# Altium schematic symbol library FPGA_Xilinx_Virtex6.SchLib: 28 symbols (part 2 of 15) (continued)
## XC6VHX255T-FF1923 (continued)
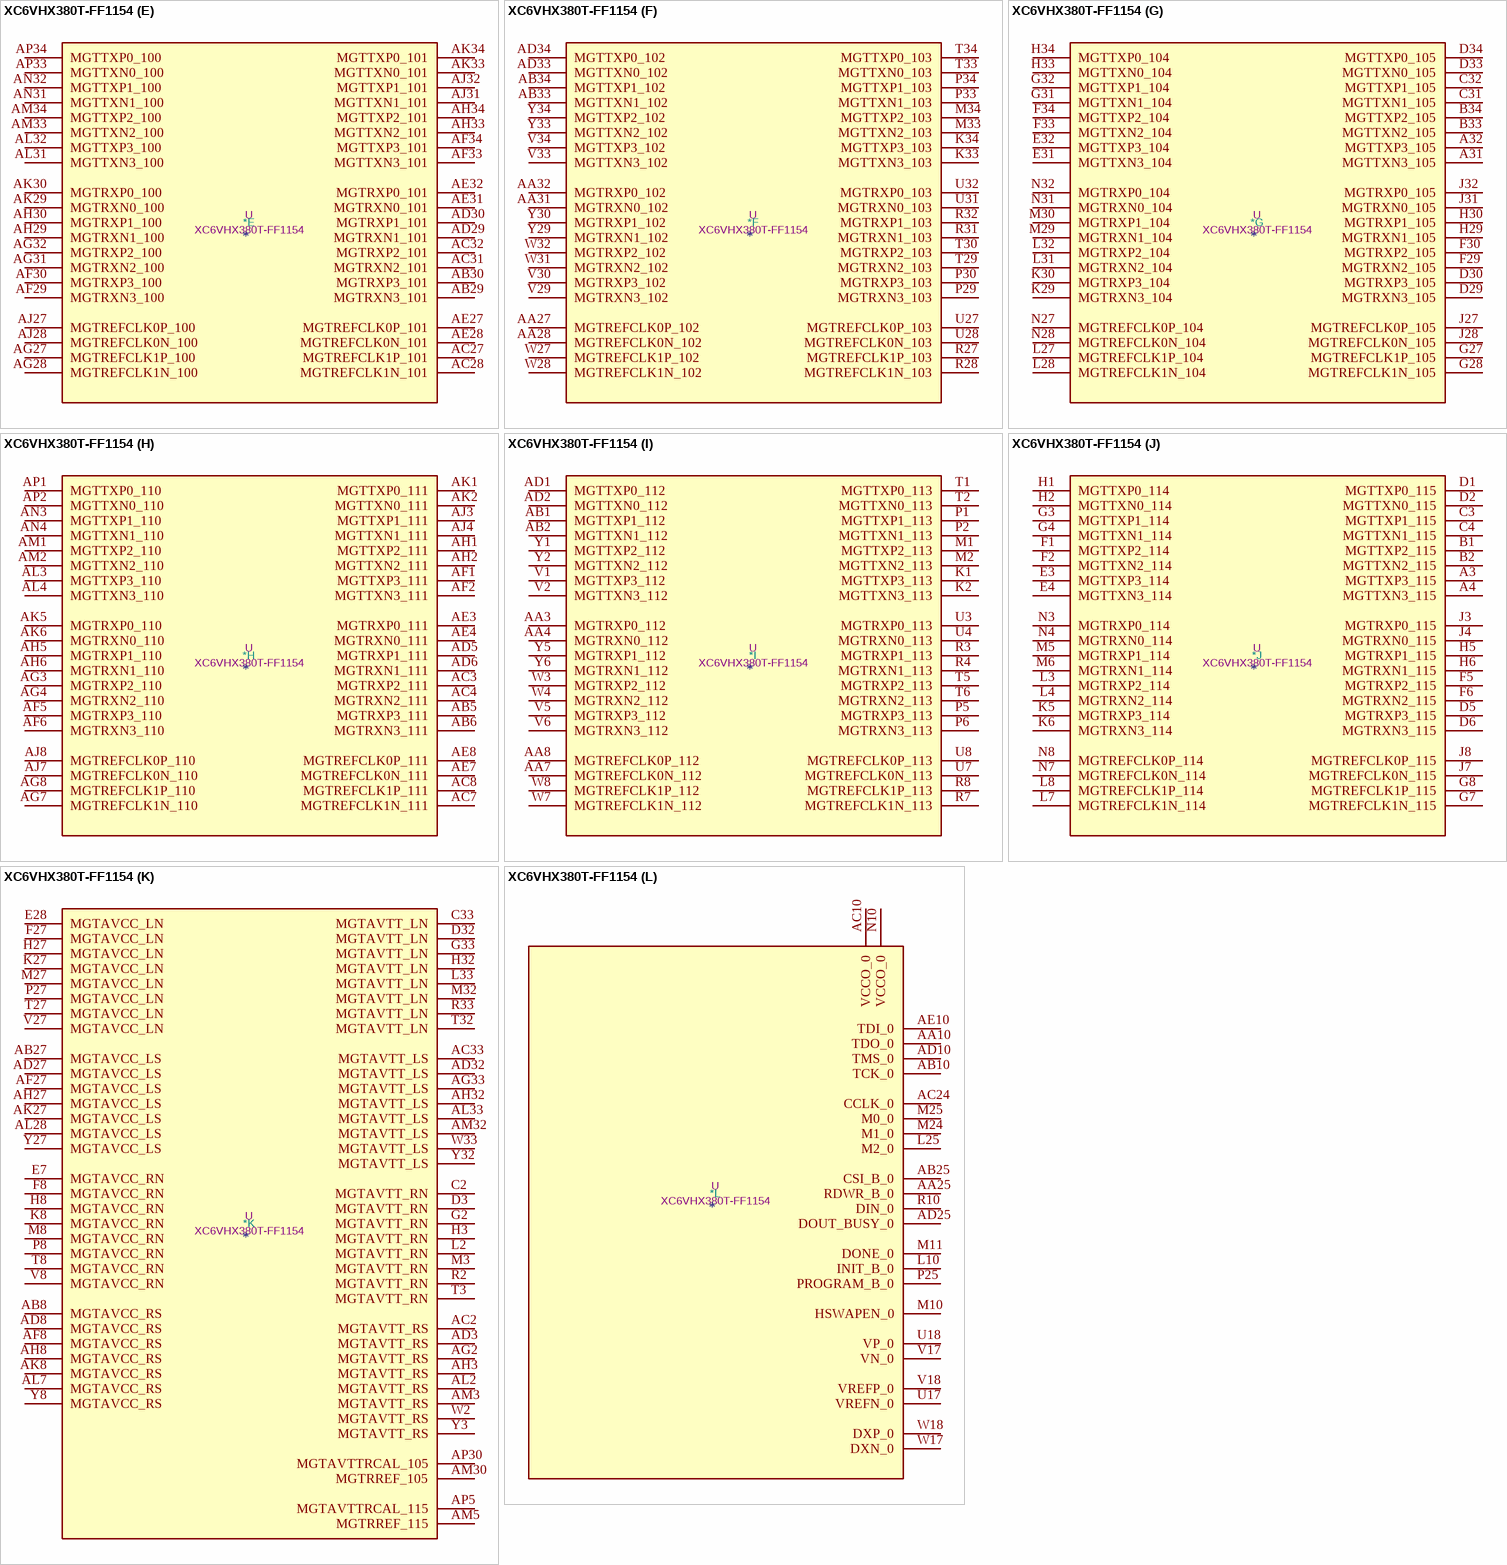
[diagram p11: symbol XC6VHX380T-FF1154]

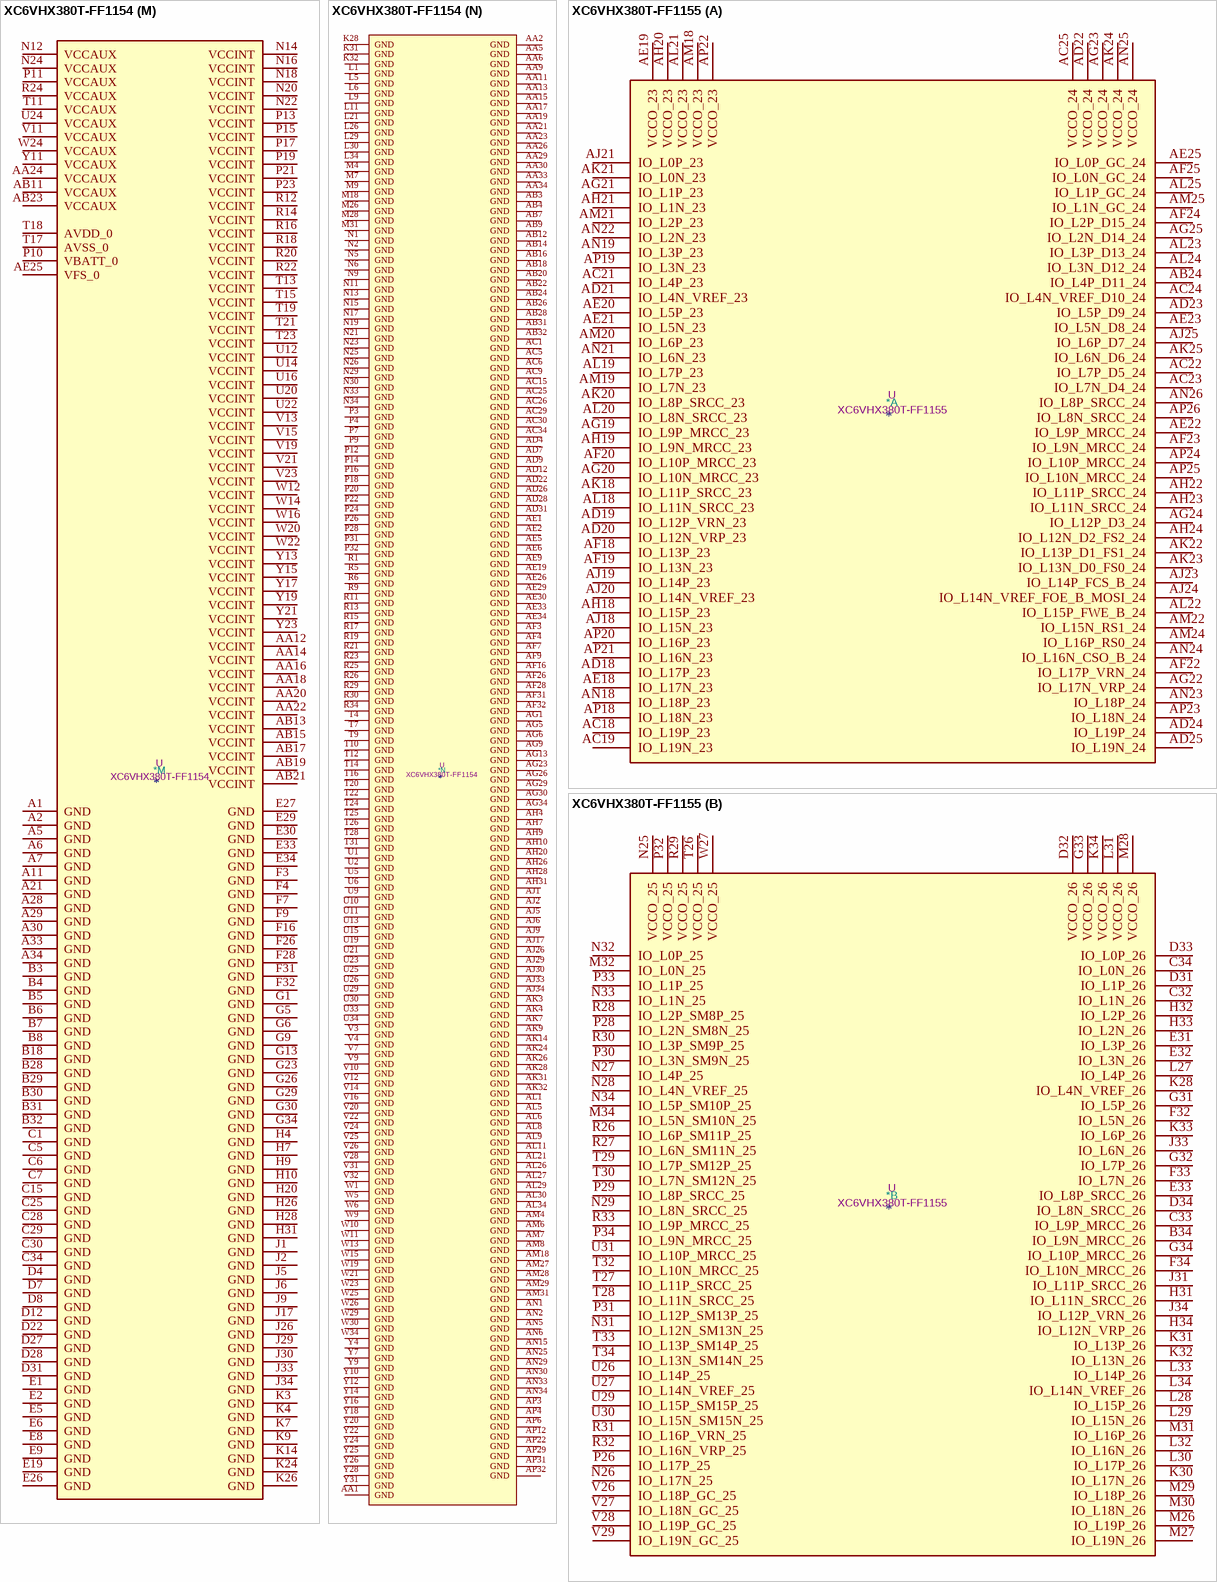
[diagram p12: symbols XC6VHX380T-FF1154 to XC6VHX380T-FF1155]

## XC6VHX380T-FF1154
designator *  value XC6VHX380T-FF1154  Reference: U
ki_keywords: FPGA; ki_description: Virtex 6 HXT 380 XC6VHX380T-FF1154
part A pins: AC18 IO_L4P_22, AC19 IO_L4N_VREF_22, AC20 VCCO_22, AC21 IO_L18P_23, AC22 IO_L18N_23, AC23 IO_L1P_23, AD18 IO_L17P_22, AD19 IO_L17N_22, AD20 IO_L9P_MRCC_22, AD21 IO_L17P_23, AD23 IO_L3P_23, AD24 IO_L1N_23, AE18 IO_L15P_22, AE20 IO_L9N_MRCC_22, AE21 IO_L17N_23, AE22 IO_L9P_MRCC_23, AE23 IO_L3N_23, AE24 VCCO_23, AF18 IO_L15N_22, AF19 IO_L7P_22, AF20 IO_L14P_22, AF21 VCCO_23, AF22 IO_L9N_MRCC_23, AF23 IO_L16P_23, AF24 IO_L16N_23, AF25 IO_L6P_23, AG18 VCCO_22, AG19 IO_L7N_22, AG20 IO_L14N_VREF_22, AG21 IO_L8P_SRCC_22, AG22 IO_L11P_SRCC_23, AG24 IO_L14P_23, AG25 IO_L6N_23, AH18 IO_L13P_22, AH19 IO_L5P_22, AH21 IO_L8N_SRCC_22, AH22 IO_L11N_SRCC_23, AH23 IO_L5P_23, AH24 IO_L14N_VREF_23, AH25 VCCO_23, AJ18 IO_L13N_22, AJ19 IO_L5N_22, AJ20 IO_L12P_VRN_22, AJ21 IO_L6P_22, AJ22 VCCO_22, AJ23 IO_L5N_23, AJ24 IO_L12P_VRN_23, AJ25 IO_L12N_VRP_23, AK18 IO_L11P_SRCC_22, AK19 VCCO_22, AK20 IO_L12N_VRP_22, AK21 IO_L6N_22, AK22 IO_L0P_22, AK23 IO_L7P_23, AK25 IO_L8P_SRCC_23, AL18 IO_L11N_SRCC_22, AL19 IO_L3P_22, AL20 IO_L10P_MRCC_22, AL22 IO_L0N_22, AL23 IO_L7N_23, AL24 IO_L10P_MRCC_23, AL25 IO_L8N_SRCC_23, AM19 IO_L3N_22, AM20 IO_L10N_MRCC_22, AM21 IO_L19P_22, AM22 IO_L2P_22, AM23 VCCO_23, AM24 IO_L19P_23, AM25 IO_L10N_MRCC_23, AM26 IO_L4P_23, AN18 IO_L1P_22, AN19 IO_L18P_22, AN20 VCCO_22, AN21 IO_L19N_22, AN22 IO_L2N_22, AN23 IO_L15P_23, AN24 IO_L19N_23, AN26 IO_L2P_23, AN27 IO_L4N_VREF_23, AN28 IO_L0P_23, AP18 IO_L1N_22, AP19 IO_L18N_22, AP20 IO_L16P_22, AP21 IO_L16N_22, AP23 IO_L15N_23, AP24 IO_L13P_23, AP25 IO_L13N_23, AP26 IO_L2N_23, AP27 VCCO_23, AP28 IO_L0N_23
part B pins: A18 IO_L9P_MRCC_25, A19 IO_L9N_MRCC_25, A20 IO_L17N_25, A22 IO_L18N_GC_25, A23 IO_L17P_VRN_24, A24 IO_L17N_VRP_24, A25 IO_L4N_VREF_D10_24, A26 VCCO_24, A27 IO_L19N_24, B19 IO_L17P_25, B20 IO_L19P_GC_25, B21 IO_L19N_GC_25, B22 IO_L18P_GC_25, B23 VCCO_25, B24 IO_L4P_D11_24, B25 IO_L2P_D15_24, B26 IO_L2N_D14_24, B27 IO_L19P_24, C18 IO_L7N_SM12N_25, C19 IO_L15N_SM15N_25, C20 VCCO_25, C21 IO_L14P_25, C22 IO_L14N_VREF_25, C23 IO_L5N_D8_24, C24 IO_L15N_RS1_24, C26 IO_L6P_D7_24, C27 IO_L6N_D6_24, D18 IO_L7P_SM12P_25, D19 IO_L15P_SM15P_25, D20 IO_L2N_SM8N_25, D21 IO_L12N_SM13N_25, D23 IO_L5P_D9_24, D24 IO_L15P_FWE_B_24, D25 IO_L8P_SRCC_24, D26 IO_L8N_SRCC_24, E18 IO_L5N_SM10N_25, E20 IO_L2P_SM8P_25, E21 IO_L12P_SM13P_25, E22 IO_L16N_VRP_25, E23 IO_L7N_D4_24, E24 VCCO_24, E25 IO_L10N_MRCC_24, F18 IO_L5P_SM10P_25, F19 IO_L13N_SM14N_25, F20 IO_L0N_25, F21 VCCO_25, F22 IO_L16P_VRN_25, F23 IO_L7P_D5_24, F24 IO_L10P_MRCC_24, F25 IO_L12N_D2_FS2_24, G18 VCCO_25, G19 IO_L13P_SM14P_25, G20 IO_L0P_25, G21 IO_L10N_MRCC_25, G22 IO_L3N_D12_24, G24 IO_L14N_VREF_FOE_B_MOSI_24, G25 IO_L12P_D3_24, H18 IO_L3N_SM9N_25, H19 IO_L11N_SRCC_25, H21 IO_L10P_MRCC_25, H22 IO_L3P_D13_24, H23 IO_L11N_SRCC_24, H24 IO_L14P_FCS_B_24, H25 VCCO_24, J18 IO_L3P_SM9P_25, J19 IO_L11P_SRCC_25, J20 IO_L8N_SRCC_25, J21 IO_L1N_GC_24, J22 VCCO_24, J23 IO_L11P_SRCC_24, J24 IO_L16P_RS0_24, J25 IO_L16N_CSO_B_24, K18 IO_L1N_25, K19 VCCO_25, K20 IO_L8P_SRCC_25, K21 IO_L1P_GC_24, K22 IO_L9N_MRCC_24, K23 IO_L13N_D0_FS0_24, K25 IO_L18N_24, L18 IO_L1P_25, L19 IO_L4N_VREF_25, L20 IO_L6N_SM11N_25, L22 IO_L9P_MRCC_24, L23 IO_L13P_D1_FS1_24, L24 IO_L18P_24, M19 IO_L4P_25, M20 IO_L6P_SM11P_25, M21 IO_L0P_GC_24, M22 IO_L0N_GC_24, M23 VCCO_24
part C pins: AC11 IO_L1N_33, AC12 IO_L1P_33, AC13 IO_L11P_SRCC_33, AC14 IO_L17P_33, AC16 IO_L9N_MRCC_32, AC17 IO_L9P_MRCC_32, AD11 IO_L0P_33, AD13 IO_L11N_SRCC_33, AD14 IO_L17N_33, AD15 IO_L10P_MRCC_32, AD16 IO_L13P_32, AD17 VCCO_32, AE11 IO_L0N_33, AE12 IO_L2P_33, AE13 IO_L13P_33, AE14 VCCO_33, AE15 IO_L10N_MRCC_32, AE16 IO_L13N_32, AE17 IO_L17P_32, AF10 IO_L6P_33, AF11 VCCO_33, AF12 IO_L2N_33, AF13 IO_L13N_33, AF14 IO_L0P_32, AF15 IO_L12P_VRN_32, AF17 IO_L17N_32, AG10 IO_L6N_33, AG11 IO_L8P_SRCC_33, AG12 IO_L3P_33, AG14 IO_L0N_32, AG15 IO_L12N_VRP_32, AG16 IO_L7P_32, AG17 IO_L15P_32, AH11 IO_L8N_SRCC_33, AH12 IO_L3N_33, AH13 IO_L15P_33, AH14 IO_L2P_32, AH15 VCCO_32, AH16 IO_L7N_32, AH17 IO_L15N_32, AJ10 IO_L10N_MRCC_33, AJ11 IO_L10P_MRCC_33, AJ12 VCCO_33, AJ13 IO_L15N_33, AJ14 IO_L2N_32, AJ15 IO_L14P_32, AJ16 IO_L5P_32, AK10 IO_L12N_VRP_33, AK11 IO_L12P_VRN_33, AK12 IO_L5P_33, AK13 IO_L6P_32, AK15 IO_L14N_VREF_32, AK16 IO_L5N_32, AK17 IO_L11P_SRCC_32, AL10 IO_L14P_33, AL12 IO_L5N_33, AL13 IO_L6N_32, AL14 IO_L8N_SRCC_32, AL15 IO_L8P_SRCC_32, AL16 VCCO_32, AL17 IO_L11N_SRCC_32, AM9 IO_L16P_33, AM10 IO_L14N_VREF_33, AM11 IO_L19P_33, AM12 IO_L7P_33, AM13 VCCO_32, AM14 IO_L16P_32, AM15 IO_L4P_32, AM16 IO_L3P_32, AM17 IO_L19P_32, AN7 IO_L4N_VREF_33, AN8 IO_L4P_33, AN9 IO_L16N_33, AN10 VCCO_33, AN11 IO_L19N_33, AN12 IO_L7N_33, AN13 IO_L16N_32, AN14 IO_L4N_VREF_32, AN16 IO_L3N_32, AN17 IO_L19N_32, AP7 VCCO_33, AP8 IO_L18N_33, AP9 IO_L18P_33, AP10 IO_L9N_MRCC_33, AP11 IO_L9P_MRCC_33, AP13 IO_L18N_32, AP14 IO_L18P_32, AP15 IO_L1N_32, AP16 IO_L1P_32, AP17 VCCO_32
part D pins: A8 IO_L2N_A14_D30_34, A9 IO_L2P_A15_D31_34, A10 IO_L11N_SRCC_34, A12 IO_L5N_A08_D24_34, A13 IO_L18N_GC_35, A14 IO_L18P_GC_35, A15 IO_L2N_SM0N_35, A16 VCCO_35, A17 IO_L4N_VREF_35, B9 IO_L6N_A06_D22_34, B10 IO_L11P_SRCC_34, B11 IO_L4N_VREF_A10_D26_34, B12 IO_L5P_A09_D25_34, B13 VCCO_34, B14 IO_L19N_GC_35, B15 IO_L2P_SM0P_35, B16 IO_L7N_SM4N_35, B17 IO_L4P_35, C8 IO_L19N_VRP_34, C9 IO_L6P_A07_D23_34, C10 VCCO_34, C11 IO_L13N_A00_D16_34, C12 IO_L4P_A11_D27_34, C13 IO_L14N_VREF_35, C14 IO_L19P_GC_35, C16 IO_L9N_MRCC_35, C17 IO_L7P_SM4P_35, D9 IO_L19P_VRN_34, D10 IO_L0N_GC_34, D11 IO_L13P_A01_D17_34, D13 IO_L14P_35, D14 IO_L8N_SRCC_35, D15 IO_L17N_35, D16 IO_L9P_MRCC_35, D17 VCCO_35, E10 IO_L8N_SRCC_34, E11 IO_L0P_GC_34, E12 IO_L15N_A22_34, E13 IO_L16N_VRP_35, E14 VCCO_35, E15 IO_L8P_SRCC_35, E16 IO_L17P_35, E17 IO_L5N_SM2N_35, F10 IO_L8P_SRCC_34, F11 VCCO_34, F12 IO_L15P_A23_34, F13 IO_L16P_VRN_35, F14 IO_L12N_SM5N_35, F15 IO_L6N_SM3N_35, F17 IO_L5P_SM2P_35, G10 IO_L10N_MRCC_34, G11 IO_L10P_MRCC_34, G12 IO_L17N_A18_34, G14 IO_L12P_SM5P_35, G15 IO_L6P_SM3P_35, G16 IO_L15N_SM7N_35, G17 IO_L3N_SM1N_35, H11 IO_L12N_A02_D18_34, H12 IO_L17P_A19_34, H13 IO_L9N_MRCC_34, H14 IO_L3N_A12_D28_34, H15 VCCO_35, H16 IO_L15P_SM7P_35, H17 IO_L3P_SM1P_35, J10 IO_L18N_A16_34, J11 IO_L12P_A03_D19_34, J12 VCCO_34, J13 IO_L9P_MRCC_34, J14 IO_L3P_A13_D29_34, J15 IO_L10N_MRCC_35, J16 IO_L11N_SRCC_35, K10 IO_L18P_A17_34, K11 IO_L14N_VREF_A24_34, K12 IO_L14P_A25_34, K13 IO_L7N_A04_D20_34, K15 IO_L10P_MRCC_35, K16 IO_L11P_SRCC_35, K17 IO_L1N_35, L12 IO_L16N_A20_34, L13 IO_L7P_A05_D21_34, L14 IO_L1N_GC_34, L15 IO_L13N_SM6N_35, L16 VCCO_35, L17 IO_L1P_35, M12 IO_L16P_A21_34, M13 VCCO_34, M14 IO_L1P_GC_34, M15 IO_L13P_SM6P_35, M16 IO_L0N_35, M17 IO_L0P_35
part E pins: AB29 MGTRXN3_101, AB30 MGTRXP3_101, AC27 MGTREFCLK1P_101, AC28 MGTREFCLK1N_101, AC31 MGTRXN2_101, AC32 MGTRXP2_101, AD29 MGTRXN1_101, AD30 MGTRXP1_101, AE27 MGTREFCLK0P_101, AE28 MGTREFCLK0N_101, AE31 MGTRXN0_101, AE32 MGTRXP0_101, AF29 MGTRXN3_100, AF30 MGTRXP3_100, AF33 MGTTXN3_101, AF34 MGTTXP3_101, AG27 MGTREFCLK1P_100, AG28 MGTREFCLK1N_100, AG31 MGTRXN2_100, AG32 MGTRXP2_100, AH29 MGTRXN1_100, AH30 MGTRXP1_100, AH33 MGTTXN2_101, AH34 MGTTXP2_101, AJ27 MGTREFCLK0P_100, AJ28 MGTREFCLK0N_100, AJ31 MGTTXN1_101, AJ32 MGTTXP1_101, AK29 MGTRXN0_100, AK30 MGTRXP0_100, AK33 MGTTXN0_101, AK34 MGTTXP0_101, AL31 MGTTXN3_100, AL32 MGTTXP3_100, AM33 MGTTXN2_100, AM34 MGTTXP2_100, AN31 MGTTXN1_100, AN32 MGTTXP1_100, AP33 MGTTXN0_100, AP34 MGTTXP0_100
part F pins: AA27 MGTREFCLK0P_102, AA28 MGTREFCLK0N_102, AA31 MGTRXN0_102, AA32 MGTRXP0_102, AB33 MGTTXN1_102, AB34 MGTTXP1_102, AD33 MGTTXN0_102, AD34 MGTTXP0_102, K33 MGTTXN3_103, K34 MGTTXP3_103, M33 MGTTXN2_103, M34 MGTTXP2_103, P29 MGTRXN3_103, P30 MGTRXP3_103, P33 MGTTXN1_103, P34 MGTTXP1_103, R27 MGTREFCLK1P_103, R28 MGTREFCLK1N_103, R31 MGTRXN1_103, R32 MGTRXP1_103, T29 MGTRXN2_103, T30 MGTRXP2_103, T33 MGTTXN0_103, T34 MGTTXP0_103, U27 MGTREFCLK0P_103, U28 MGTREFCLK0N_103, U31 MGTRXN0_103, U32 MGTRXP0_103, V29 MGTRXN3_102, V30 MGTRXP3_102, V33 MGTTXN3_102, V34 MGTTXP3_102, W27 MGTREFCLK1P_102, W28 MGTREFCLK1N_102, W31 MGTRXN2_102, W32 MGTRXP2_102, Y29 MGTRXN1_102, Y30 MGTRXP1_102, Y33 MGTTXN2_102, Y34 MGTTXP2_102
part G pins: A31 MGTTXN3_105, A32 MGTTXP3_105, B33 MGTTXN2_105, B34 MGTTXP2_105, C31 MGTTXN1_105, C32 MGTTXP1_105, D29 MGTRXN3_105, D30 MGTRXP3_105, D33 MGTTXN0_105, D34 MGTTXP0_105, E31 MGTTXN3_104, E32 MGTTXP3_104, F29 MGTRXN2_105, F30 MGTRXP2_105, F33 MGTTXN2_104, F34 MGTTXP2_104, G27 MGTREFCLK1P_105, G28 MGTREFCLK1N_105, G31 MGTTXN1_104, G32 MGTTXP1_104, H29 MGTRXN1_105, H30 MGTRXP1_105, H33 MGTTXN0_104, H34 MGTTXP0_104, J27 MGTREFCLK0P_105, J28 MGTREFCLK0N_105, J31 MGTRXN0_105, J32 MGTRXP0_105, K29 MGTRXN3_104, K30 MGTRXP3_104, L27 MGTREFCLK1P_104, L28 MGTREFCLK1N_104, L31 MGTRXN2_104, L32 MGTRXP2_104, M29 MGTRXN1_104, M30 MGTRXP1_104, N27 MGTREFCLK0P_104, N28 MGTREFCLK0N_104, N31 MGTRXN0_104, N32 MGTRXP0_104
part H pins: AB5 MGTRXP3_111, AB6 MGTRXN3_111, AC3 MGTRXP2_111, AC4 MGTRXN2_111, AC7 MGTREFCLK1N_111, AC8 MGTREFCLK1P_111, AD5 MGTRXP1_111, AD6 MGTRXN1_111, AE3 MGTRXP0_111, AE4 MGTRXN0_111, AE7 MGTREFCLK0N_111, AE8 MGTREFCLK0P_111, AF1 MGTTXP3_111, AF2 MGTTXN3_111, AF5 MGTRXP3_110, AF6 MGTRXN3_110, AG3 MGTRXP2_110, AG4 MGTRXN2_110, AG7 MGTREFCLK1N_110, AG8 MGTREFCLK1P_110, AH1 MGTTXP2_111, AH2 MGTTXN2_111, AH5 MGTRXP1_110, AH6 MGTRXN1_110, AJ3 MGTTXP1_111, AJ4 MGTTXN1_111, AJ7 MGTREFCLK0N_110, AJ8 MGTREFCLK0P_110, AK1 MGTTXP0_111, AK2 MGTTXN0_111, AK5 MGTRXP0_110, AK6 MGTRXN0_110, AL3 MGTTXP3_110, AL4 MGTTXN3_110, AM1 MGTTXP2_110, AM2 MGTTXN2_110, AN3 MGTTXP1_110, AN4 MGTTXN1_110, AP1 MGTTXP0_110, AP2 MGTTXN0_110
part I pins: AA3 MGTRXP0_112, AA4 MGTRXN0_112, AA7 MGTREFCLK0N_112, AA8 MGTREFCLK0P_112, AB1 MGTTXP1_112, AB2 MGTTXN1_112, AD1 MGTTXP0_112, AD2 MGTTXN0_112, K1 MGTTXP3_113, K2 MGTTXN3_113, M1 MGTTXP2_113, M2 MGTTXN2_113, P1 MGTTXP1_113, P2 MGTTXN1_113, P5 MGTRXP3_113, P6 MGTRXN3_113, R3 MGTRXP1_113, R4 MGTRXN1_113, R7 MGTREFCLK1N_113, R8 MGTREFCLK1P_113, T1 MGTTXP0_113, T2 MGTTXN0_113, T5 MGTRXP2_113, T6 MGTRXN2_113, U3 MGTRXP0_113, U4 MGTRXN0_113, U7 MGTREFCLK0N_113, U8 MGTREFCLK0P_113, V1 MGTTXP3_112, V2 MGTTXN3_112, V5 MGTRXP3_112, V6 MGTRXN3_112, W3 MGTRXP2_112, W4 MGTRXN2_112, W7 MGTREFCLK1N_112, W8 MGTREFCLK1P_112, Y1 MGTTXP2_112, Y2 MGTTXN2_112, Y5 MGTRXP1_112, Y6 MGTRXN1_112
part J pins: A3 MGTTXP3_115, A4 MGTTXN3_115, B1 MGTTXP2_115, B2 MGTTXN2_115, C3 MGTTXP1_115, C4 MGTTXN1_115, D1 MGTTXP0_115, D2 MGTTXN0_115, D5 MGTRXP3_115, D6 MGTRXN3_115, E3 MGTTXP3_114, E4 MGTTXN3_114, F1 MGTTXP2_114, F2 MGTTXN2_114, F5 MGTRXP2_115, F6 MGTRXN2_115, G3 MGTTXP1_114, G4 MGTTXN1_114, G7 MGTREFCLK1N_115, G8 MGTREFCLK1P_115, H1 MGTTXP0_114, H2 MGTTXN0_114, H5 MGTRXP1_115, H6 MGTRXN1_115, J3 MGTRXP0_115, J4 MGTRXN0_115, J7 MGTREFCLK0N_115, J8 MGTREFCLK0P_115, K5 MGTRXP3_114, K6 MGTRXN3_114, L3 MGTRXP2_114, L4 MGTRXN2_114, L7 MGTREFCLK1N_114, L8 MGTREFCLK1P_114, M5 MGTRXP1_114, M6 MGTRXN1_114, N3 MGTRXP0_114, N4 MGTRXN0_114, N7 MGTREFCLK0N_114, N8 MGTREFCLK0P_114
part K pins: AB8 MGTAVCC_RS, AB27 MGTAVCC_LS, AC2 MGTAVTT_RS, AC33 MGTAVTT_LS, AD3 MGTAVTT_RS, AD8 MGTAVCC_RS, AD27 MGTAVCC_LS, AD32 MGTAVTT_LS, AF8 MGTAVCC_RS, AF27 MGTAVCC_LS, AG2 MGTAVTT_RS, AG33 MGTAVTT_LS, AH3 MGTAVTT_RS, AH8 MGTAVCC_RS, AH27 MGTAVCC_LS, AH32 MGTAVTT_LS, AK8 MGTAVCC_RS, AK27 MGTAVCC_LS, AL2 MGTAVTT_RS, AL7 MGTAVCC_RS, AL28 MGTAVCC_LS, AL33 MGTAVTT_LS, AM3 MGTAVTT_RS, AM5 MGTRREF_115, AM30 MGTRREF_105, AM32 MGTAVTT_LS, AP5 MGTAVTTRCAL_115, AP30 MGTAVTTRCAL_105, C2 MGTAVTT_RN, C33 MGTAVTT_LN, D3 MGTAVTT_RN, D32 MGTAVTT_LN, E7 MGTAVCC_RN, E28 MGTAVCC_LN, F8 MGTAVCC_RN, F27 MGTAVCC_LN, G2 MGTAVTT_RN, G33 MGTAVTT_LN, H3 MGTAVTT_RN, H8 MGTAVCC_RN, H27 MGTAVCC_LN, H32 MGTAVTT_LN, K8 MGTAVCC_RN, K27 MGTAVCC_LN, L2 MGTAVTT_RN, L33 MGTAVTT_LN, M3 MGTAVTT_RN, M8 MGTAVCC_RN, M27 MGTAVCC_LN, M32 MGTAVTT_LN, P8 MGTAVCC_RN, P27 MGTAVCC_LN, R2 MGTAVTT_RN, R33 MGTAVTT_LN, T3 MGTAVTT_RN, T8 MGTAVCC_RN, T27 MGTAVCC_LN, T32 MGTAVTT_LN, V8 MGTAVCC_RN, V27 MGTAVCC_LN, W2 MGTAVTT_RS, W33 MGTAVTT_LS, Y3 MGTAVTT_RS, Y8 MGTAVCC_RS, Y27 MGTAVCC_LS, Y32 MGTAVTT_LS
part L pins: AA10 TDO_0, AA25 RDWR_B_0, AB10 TCK_0, AB25 CSI_B_0, AC10 VCCO_0, AC24 CCLK_0, AD10 TMS_0, AD25 DOUT_BUSY_0, AE10 TDI_0, L10 INIT_B_0, L25 M2_0, M10 HSWAPEN_0, M11 DONE_0, M24 M1_0, M25 M0_0, N10 VCCO_0, P25 PROGRAM_B_0, R10 DIN_0, U17 VREFN_0, U18 VP_0, V17 VN_0, V18 VREFP_0, W17 DXN_0, W18 DXP_0
part M pins: A1 GND, A2 GND, A5 GND, A6 GND, A7 GND, A11 GND, A21 GND, A28 GND, A29 GND, A30 GND, A33 GND, A34 GND, AA12 VCCINT, AA14 VCCINT, AA16 VCCINT, AA18 VCCINT, AA20 VCCINT, AA22 VCCINT, AA24 VCCAUX, AB11 VCCAUX, AB13 VCCINT, AB15 VCCINT, AB17 VCCINT, AB19 VCCINT, AB21 VCCINT, AB23 VCCAUX, AE25 VFS_0, B3 GND, B4 GND, B5 GND, B6 GND, B7 GND, B8 GND, B18 GND, B28 GND, B29 GND, B30 GND, B31 GND, B32 GND, C1 GND, C5 GND, C6 GND, C7 GND, C15 GND, C25 GND, C28 GND, C29 GND, C30 GND, C34 GND, D4 GND, D7 GND, D8 GND, D12 GND, D22 GND, D27 GND, D28 GND, D31 GND, E1 GND, E2 GND, E5 GND, E6 GND, E8 GND, E9 GND, E19 GND, E26 GND, E27 GND, E29 GND, E30 GND, E33 GND, E34 GND, F3 GND, F4 GND, F7 GND, F9 GND, F16 GND, F26 GND, F28 GND, F31 GND, F32 GND, G1 GND, G5 GND, G6 GND, G9 GND, G13 GND, G23 GND, G26 GND, G29 GND, G30 GND, G34 GND, H4 GND, H7 GND, H9 GND, H10 GND, H20 GND, H26 GND, H28 GND, H31 GND, J1 GND, J2 GND, J5 GND, J6 GND, J9 GND, J17 GND, J26 GND, J29 GND, J30 GND, J33 GND, J34 GND, K3 GND, K4 GND, K7 GND, K9 GND, K14 GND, K24 GND, K26 GND, N12 VCCAUX, N14 VCCINT, N16 VCCINT, N18 VCCINT, N20 VCCINT, N22 VCCINT, N24 VCCAUX, P10 VBATT_0, P11 VCCAUX, P13 VCCINT, P15 VCCINT, P17 VCCINT, P19 VCCINT, P21 VCCINT, P23 VCCINT, R12 VCCINT, R14 VCCINT, R16 VCCINT, R18 VCCINT, R20 VCCINT, R22 VCCINT, R24 VCCAUX, T11 VCCAUX, T13 VCCINT, T15 VCCINT, T17 AVSS_0, T18 AVDD_0, T19 VCCINT, T21 VCCINT, T23 VCCINT, U12 VCCINT, U14 VCCINT, U16 VCCINT, U20 VCCINT, U22 VCCINT, U24 VCCAUX, V11 VCCAUX, V13 VCCINT, V15 VCCINT, V19 VCCINT, V21 VCCINT, V23 VCCINT, W12 VCCINT, W14 VCCINT, W16 VCCINT, W20 VCCINT, W22 VCCINT, W24 VCCAUX, Y11 VCCAUX, Y13 VCCINT, Y15 VCCINT, Y17 VCCINT, Y19 VCCINT, Y21 VCCINT, Y23 VCCINT
part N pins: AA1 GND, AA2 GND, AA5 GND, AA6 GND, AA9 GND, AA11 GND, AA13 GND, AA15 GND, AA17 GND, AA19 GND, AA21 GND, AA23 GND, AA26 GND, AA29 GND, AA30 GND, AA33 GND, AA34 GND, AB3 GND, AB4 GND, AB7 GND, AB9 GND, AB12 GND, AB14 GND, AB16 GND, AB18 GND, AB20 GND, AB22 GND, AB24 GND, AB26 GND, AB28 GND, AB31 GND, AB32 GND, AC1 GND, AC5 GND, AC6 GND, AC9 GND, AC15 GND, AC25 GND, AC26 GND, AC29 GND, AC30 GND, AC34 GND, AD4 GND, AD7 GND, AD9 GND, AD12 GND, AD22 GND, AD26 GND, AD28 GND, AD31 GND, AE1 GND, AE2 GND, AE5 GND, AE6 GND, AE9 GND, AE19 GND, AE26 GND, AE29 GND, AE30 GND, AE33 GND, AE34 GND, AF3 GND, AF4 GND, AF7 GND, AF9 GND, AF16 GND, AF26 GND, AF28 GND, AF31 GND, AF32 GND, AG1 GND, AG5 GND, AG6 GND, AG9 GND, AG13 GND, AG23 GND, AG26 GND, AG29 GND, AG30 GND, AG34 GND, AH4 GND, AH7 GND, AH9 GND, AH10 GND, AH20 GND, AH26 GND, AH28 GND, AH31 GND, AJ1 GND, AJ2 GND, AJ5 GND, AJ6 GND, AJ9 GND, AJ17 GND, AJ26 GND, AJ29 GND, AJ30 GND, AJ33 GND, AJ34 GND, AK3 GND, AK4 GND, AK7 GND, AK9 GND, AK14 GND, AK24 GND, AK26 GND, AK28 GND, AK31 GND, AK32 GND, AL1 GND, AL5 GND, AL6 GND, AL8 GND, AL9 GND, AL11 GND, AL21 GND, AL26 GND, AL27 GND, AL29 GND, AL30 GND, AL34 GND, AM4 GND, AM6 GND, AM7 GND, AM8 GND, AM18 GND, AM27 GND, AM28 GND, AM29 GND, AM31 GND, AN1 GND, AN2 GND, AN5 GND, AN6 GND, AN15 GND, AN25 GND, AN29 GND, AN30 GND, AN33 GND, AN34 GND, AP3 GND, AP4 GND, AP6 GND, AP12 GND, AP22 GND, AP29 GND, AP31 GND, AP32 GND, K28 GND, K31 GND, K32 GND, L1 GND, L5 GND, L6 GND, L9 GND, L11 GND, L21 GND, L26 GND, L29 GND, L30 GND, L34 GND, M4 GND, M7 GND, M9 GND, M18 GND, M26 GND, M28 GND, M31 GND, N1 GND, N2 GND, N5 GND, N6 GND, N9 GND, N11 GND, N13 GND, N15 GND, N17 GND, N19 GND, N21 GND, N23 GND, N25 GND, N26 GND, N29 GND, N30 GND, N33 GND, N34 GND, P3 GND, P4 GND, P7 GND, P9 GND, P12 GND, P14 GND, P16 GND, P18 GND, P20 GND, P22 GND, P24 GND, P26 GND, P28 GND, P31 GND, P32 GND, R1 GND, R5 GND, R6 GND, R9 GND, R11 GND, R13 GND, R15 GND, R17 GND, R19 GND, R21 GND, R23 GND, R25 GND, R26 GND, R29 GND, R30 GND, R34 GND, T4 GND, T7 GND, T9 GND, T10 GND, T12 GND, T14 GND, T16 GND, T20 GND, T22 GND, T24 GND, T25 GND, T26 GND, T28 GND, T31 GND, U1 GND, U2 GND, U5 GND, U6 GND, U9 GND, U10 GND, U11 GND, U13 GND, U15 GND, U19 GND, U21 GND, U23 GND, U25 GND, U26 GND, U29 GND, U30 GND, U33 GND, U34 GND, V3 GND, V4 GND, V7 GND, V9 GND, V10 GND, V12 GND, V14 GND, V16 GND, V20 GND, V22 GND, V24 GND, V25 GND, V26 GND, V28 GND, V31 GND, V32 GND, W1 GND, W5 GND, W6 GND, W9 GND, W10 GND, W11 GND, W13 GND, W15 GND, W19 GND, W21 GND, W23 GND, W25 GND, W26 GND, W29 GND, W30 GND, W34 GND, Y4 GND, Y7 GND, Y9 GND, Y10 GND, Y12 GND, Y14 GND, Y16 GND, Y18 GND, Y20 GND, Y22 GND, Y24 GND, Y25 GND, Y26 GND, Y28 GND, Y31 GND

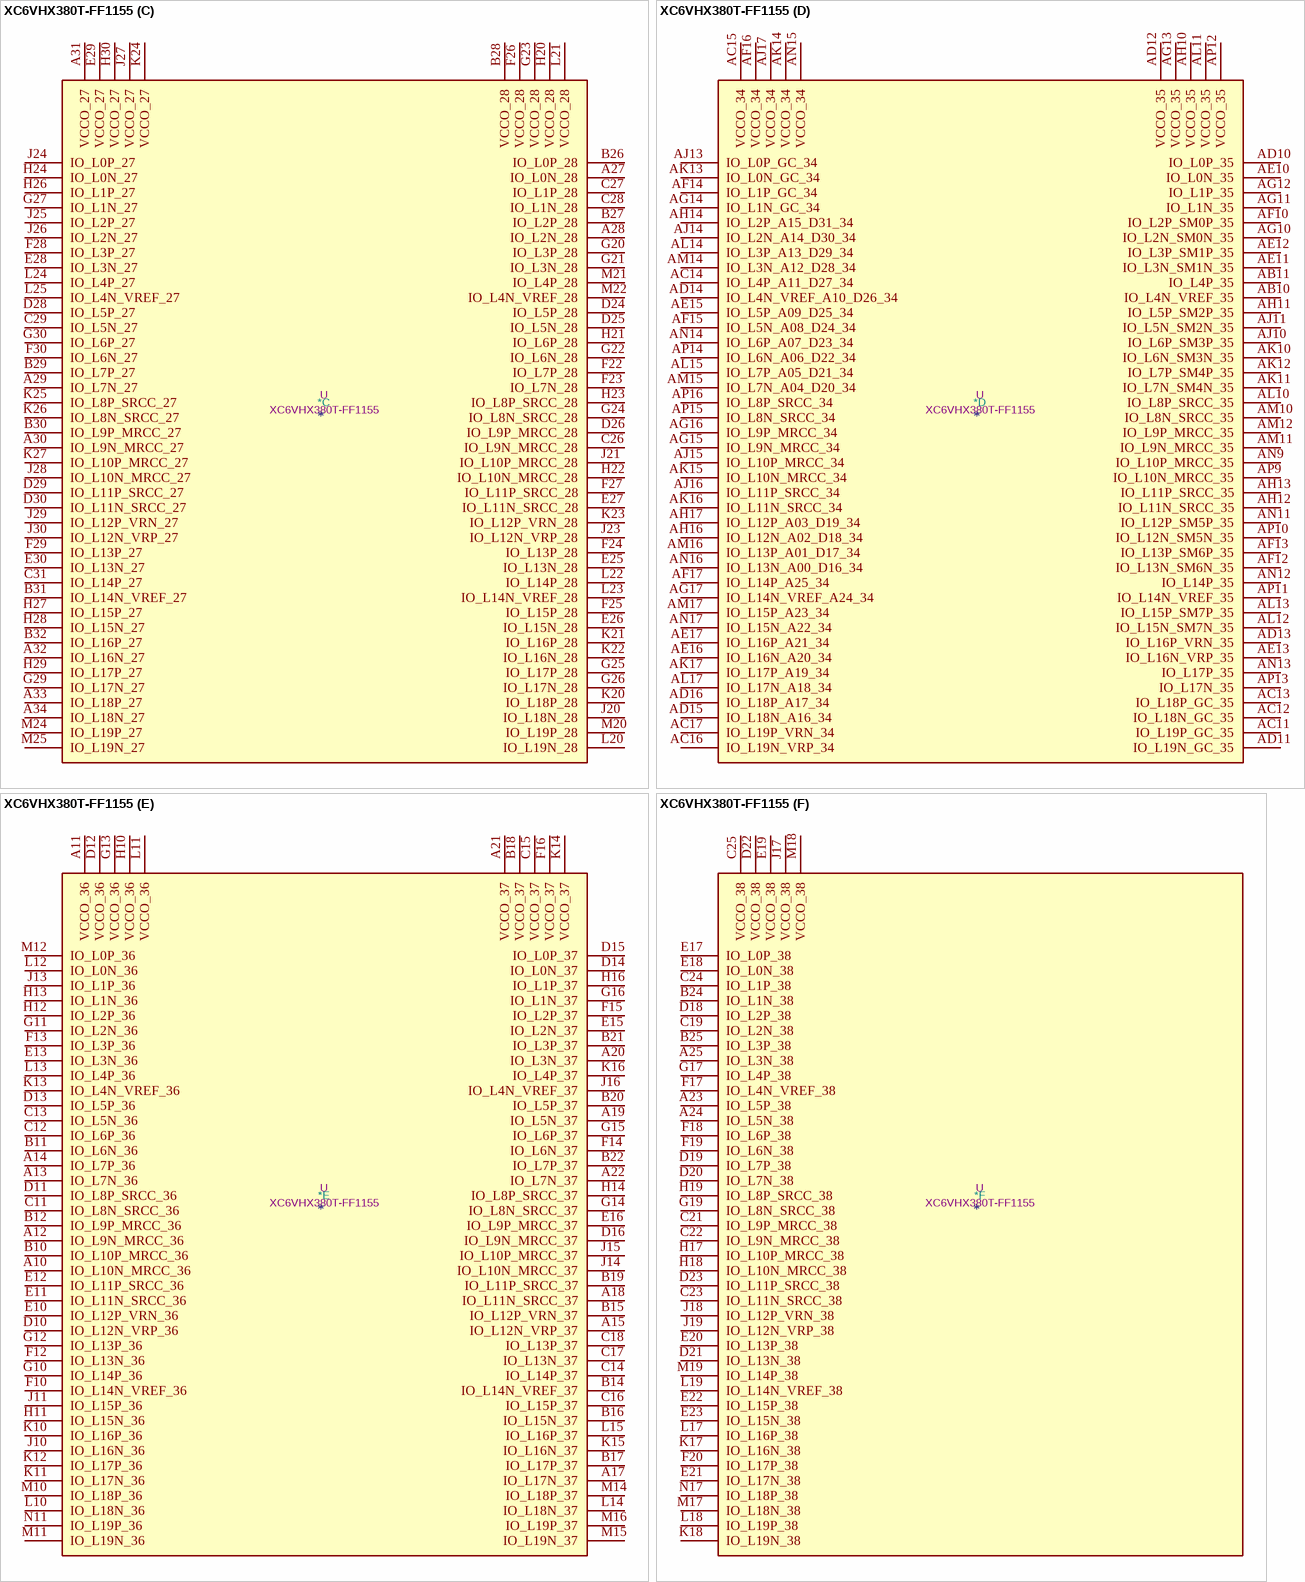
[diagram p13: symbol XC6VHX380T-FF1155]

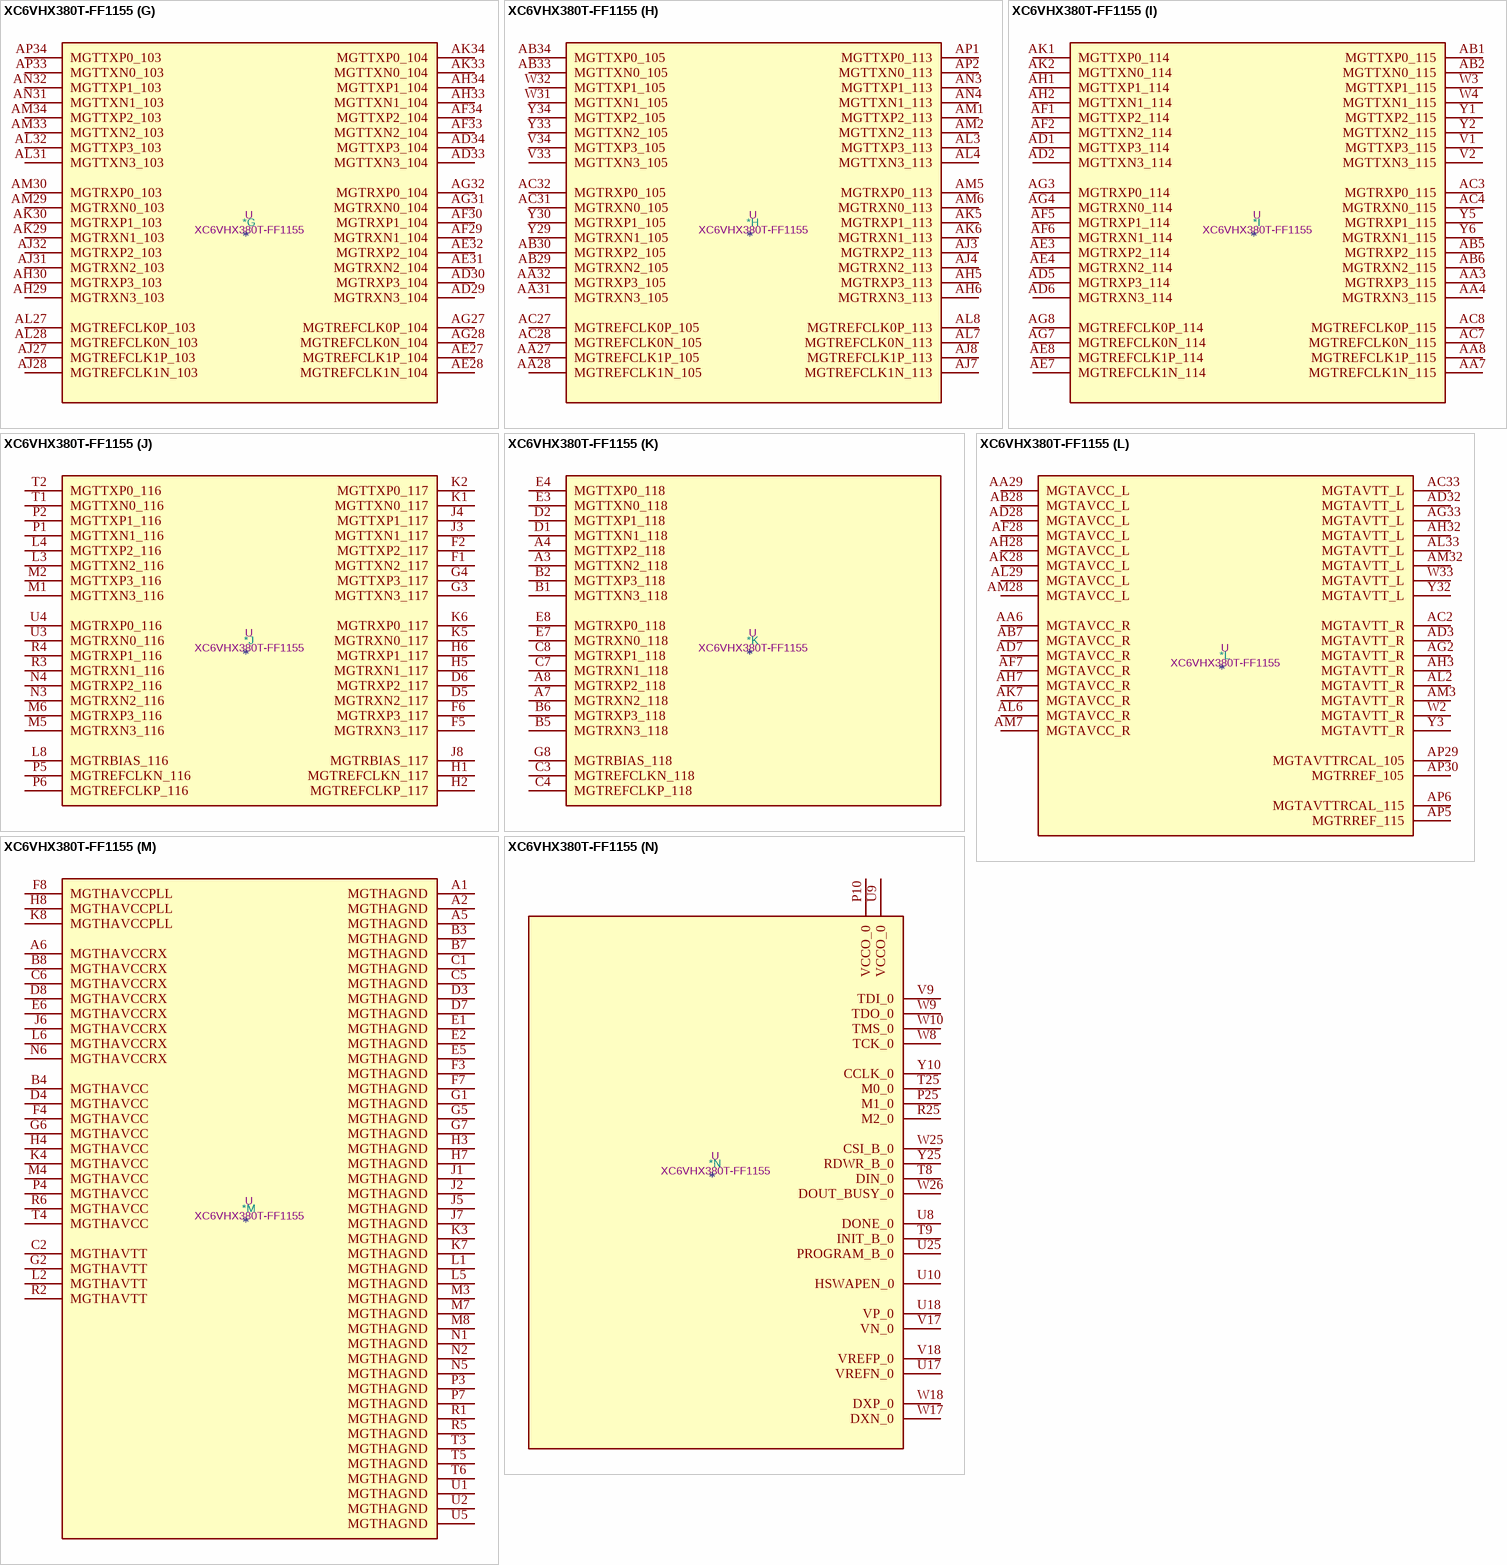
[diagram p14: symbol XC6VHX380T-FF1155]

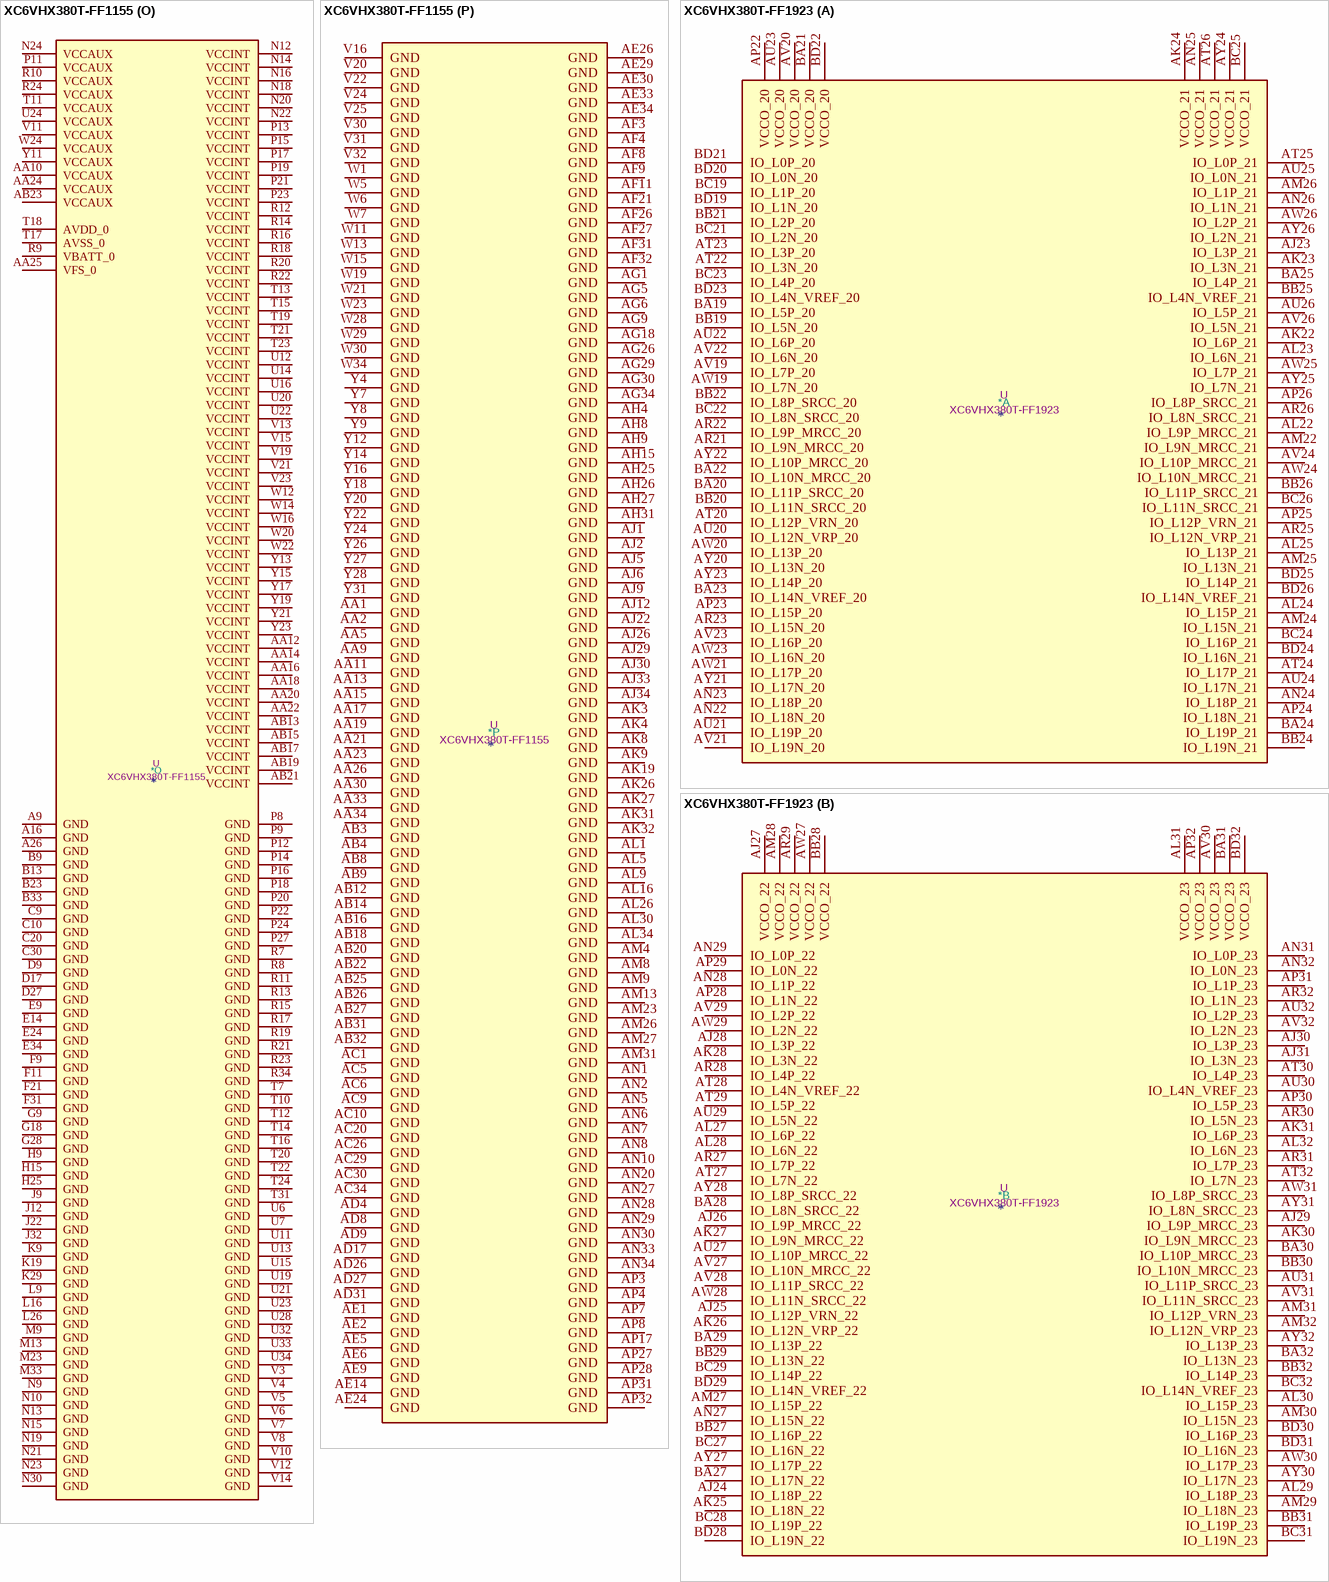
[diagram p15: symbols XC6VHX380T-FF1155 to XC6VHX380T-FF1923]